# Altium footprint library 3D_MIG_Controller.PCBLIB: 560 footprints (part 30 of 35)
Each footprint in its own frame and in the unit in brackets; x right, y up, seen from the top. Pads: shape width x height; smd on the part's side, far side on the other; paste and mask are expansions set on the pad; w line width, h text height; cw(c..) or ccw(c..) is an arc to the next point about the centre after c.
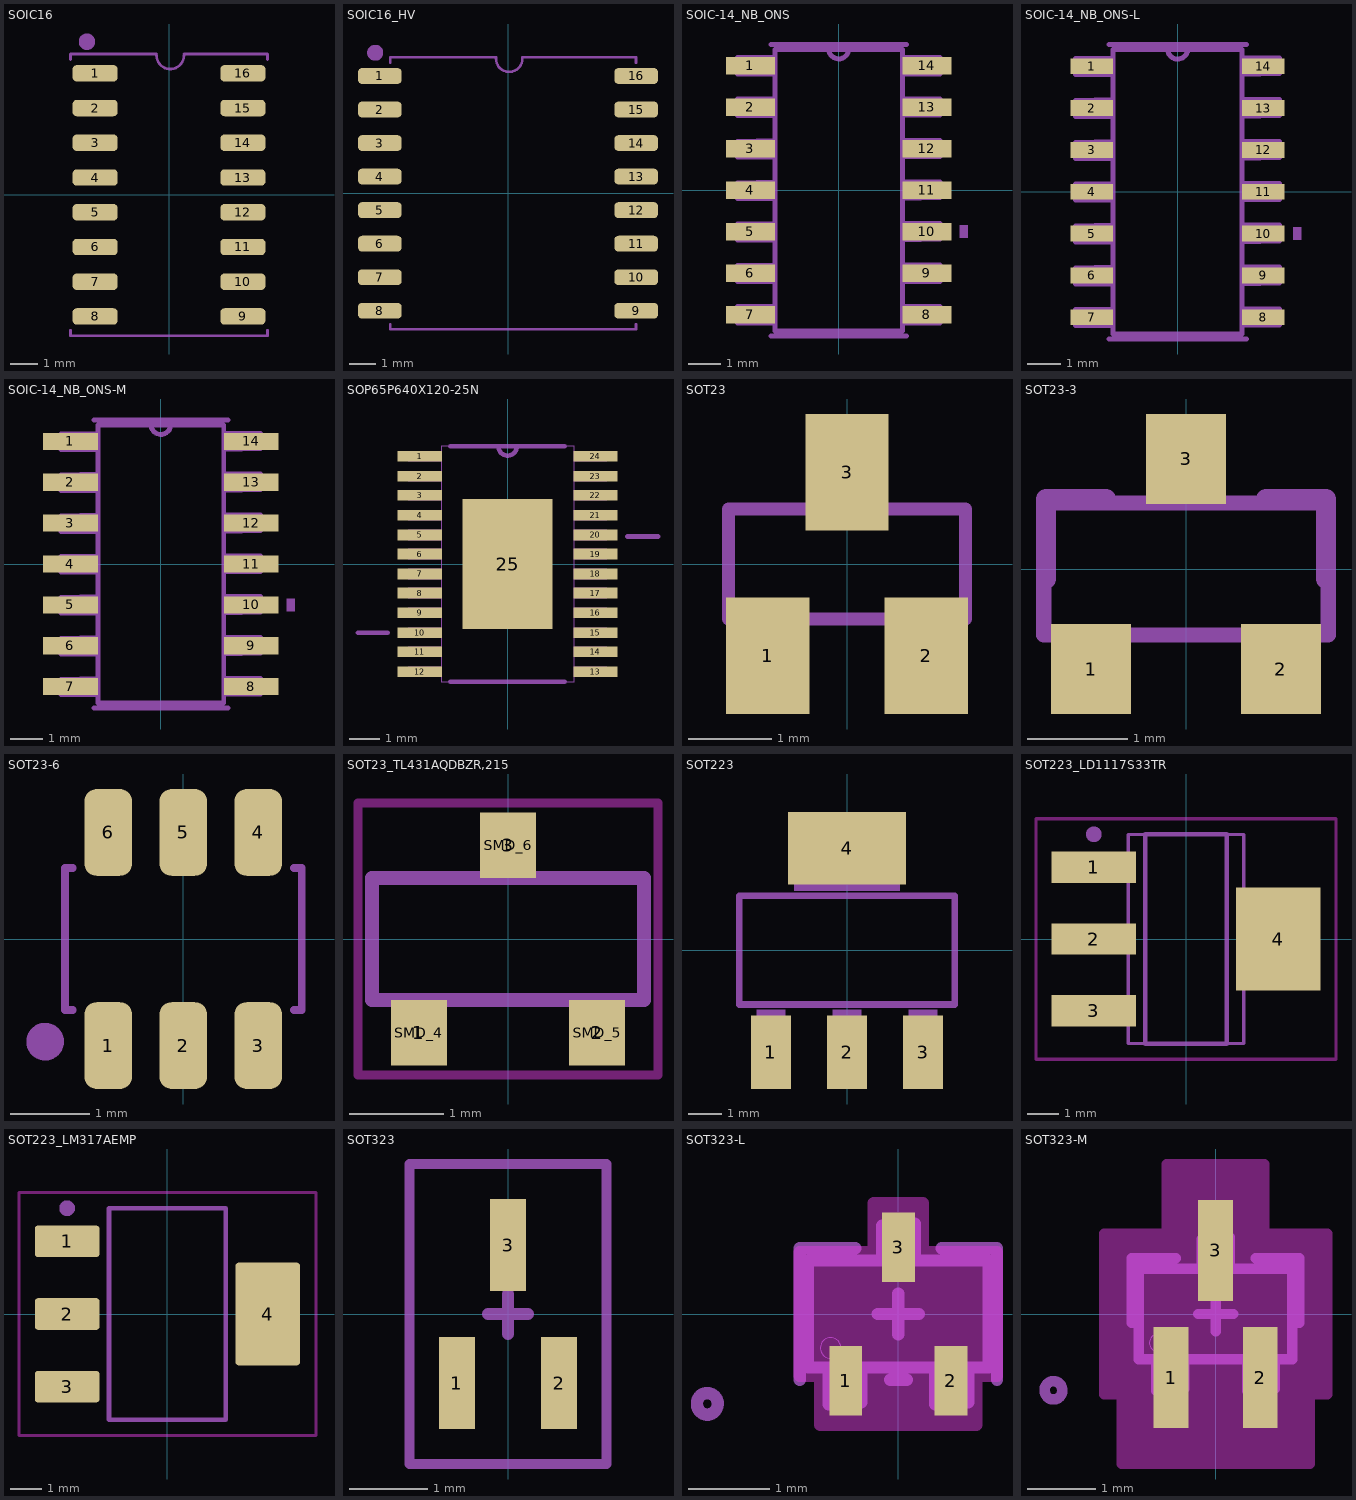
[diagram p29: the footprints below, top view; thin cyan lines are the x and y axes]

## SOIC16 [mm]
pads (16):
  rrect50% 1.65x0.6 smd: 1(-2.7,4.445) 2(-2.7,3.175) 3(-2.7,1.905) 4(-2.7,0.635) 5(-2.7,-0.635) 6(-2.7,-1.905) 7(-2.7,-3.175) 8(-2.7,-4.445) 9(2.7,-4.445) 10(2.7,-3.175) 11(2.7,-1.905) 12(2.7,-0.635) 13(2.7,0.635) 14(2.7,1.905) 15(2.7,3.175) 16(2.7,4.445)
tPlace:
  circle w0.4: c-3,5.6 r0.1
  lines w0.1: -3.6,-4.95 -3.6,-5.15 3.6,-5.15 3.6,-4.95 ; -3.6,4.95 -3.6,5.15 -0.455,5.15 ; -0.455,5.1 ccw(c0.045,5.1) 0.545,5.1 ; 0.545,5.15 3.6,5.15 3.6,4.95

## SOIC16_HV [mm]
pads (16):
  rrect50% 1.65x0.6 smd: 1(-4.855,4.445) 2(-4.855,3.175) 3(-4.855,1.905) 4(-4.855,0.635) 5(-4.855,-0.635) 6(-4.855,-1.905) 7(-4.855,-3.175) 8(-4.855,-4.445) 9(4.855,-4.445) 10(4.855,-3.175) 11(4.855,-1.905) 12(4.855,-0.635) 13(4.855,0.635) 14(4.855,1.905) 15(4.855,3.175) 16(4.855,4.445)
tPlace:
  circle w0.4: c-5.03,5.325 r0.1
  lines w0.1: -4.455,-4.95 -4.455,-5.15 4.845,-5.15 4.845,-4.95 ; -4.455,4.95 -4.455,5.15 -0.455,5.15 ; -0.455,5.1 ccw(c0.045,5.1) 0.545,5.1 ; 0.545,5.15 4.845,5.15 4.845,4.95

## SOIC-14_NB_ONS [mil]
pads (14):
  rect 59x21 smd: 1(-106.5,150) 2(-106.5,100) 3(-106.5,50) 4(-106.5,0) 5(-106.5,-50) 6(-106.5,-100) 7(-106.5,-150) 8(106.5,-150) 9(106.5,-100) 10(106.5,-50) 11(106.5,0) 12(106.5,50) 13(106.5,100) 14(106.5,150)
tDocu:
  lines w6: 12,171 cw(c0,170.5) -12,170 ; -12,170 77,170 77,-170 -77,-170 -77,170 -12,170 ; -122,-160 -122,-140 -77,-140 -77,-160 -122,-160 ; -122,-110 -122,-91 -77,-90 -77,-110 -122,-110 ; -122,-60 -122,-41 -77,-40 -77,-60 -122,-60 ; -122,-10 -122,9 -77,10 -77,-10 -122,-10 ; -122,40 -122,59 -77,60 -77,40 -122,40 ; -122,90 -122,110 -77,110 -77,90 -122,90 ; -122,140 -122,160 -77,160 -77,140 -122,140 ; 77,-160 77,-140 122,-140 122,-160 77,-160 ; 77,-110 77,-90 122,-90 122,-110 77,-110 ; 77,-60 77,-40 122,-40 122,-59 77,-60 ; 77,-10 77,10 122,10 122,-9 77,-10 ; 77,40 77,60 122,60 122,41 77,40 ; 77,90 77,110 122,110 122,91 77,90 ; 77,140 77,160 122,160 122,140 77,140
  text "*" at -85,118 h77.5
tPlace:
  region: 156,-42.5 156,-57.5 146,-57.5 146,-42.5
  lines w6: -82,-176 82,-176 ; -82,176 82,176
  text "*" at -139,166 h77.5

## SOIC-14_NB_ONS-L [mil]
pads (14):
  rect 51x19 smd: 1(-102.5,150) 2(-102.5,100) 3(-102.5,50) 4(-102.5,0) 5(-102.5,-50) 6(-102.5,-100) 7(-102.5,-150) 8(102.5,-150) 9(102.5,-100) 10(102.5,-50) 11(102.5,0) 12(102.5,50) 13(102.5,100) 14(102.5,150)
tDocu:
  lines w6: 12,171 cw(c0,170.5) -12,170 ; -12,170 77,170 77,-170 -77,-170 -77,170 -12,170 ; -122,-160 -122,-141 -77,-140 -77,-160 -122,-160 ; -122,-110 -122,-91 -77,-90 -77,-110 -122,-110 ; -122,-60 -122,-41 -77,-40 -77,-60 -122,-60 ; -122,-10 -122,9 -77,10 -77,-10 -122,-10 ; -122,40 -122,59 -77,60 -77,40 -122,40 ; -122,90 -122,109 -77,110 -77,90 -122,90 ; -122,140 -122,159 -77,160 -77,140 -122,140 ; 77,-160 77,-140 122,-140 122,-159 77,-160 ; 77,-110 77,-90 122,-90 122,-109 77,-110 ; 77,-60 77,-40 122,-40 122,-59 77,-60 ; 77,-10 77,10 122,10 122,-9 77,-10 ; 77,40 77,60 122,60 122,41 77,40 ; 77,90 77,110 122,110 122,91 77,90 ; 77,140 77,160 122,160 122,141 77,140
  text "*" at -85,118 h77.5
tPlace:
  region: 148,-42.5 148,-57.5 138,-57.5 138,-42.5
  lines w6: -82,-176 82,-176 ; -82,176 82,176
  text "*" at -135,164 h77.5

## SOIC-14_NB_ONS-M [mil]
pads (14):
  rect 67x21 smd: 1(-110.5,150) 2(-110.5,100) 3(-110.5,50) 4(-110.5,0) 5(-110.5,-50) 6(-110.5,-100) 7(-110.5,-150) 8(110.5,-150) 9(110.5,-100) 10(110.5,-50) 11(110.5,0) 12(110.5,50) 13(110.5,100) 14(110.5,150)
tDocu:
  lines w6: 12,171 cw(c0,170.5) -12,170 ; -12,170 77,170 77,-170 -77,-170 -77,170 -12,170 ; -122,-160 -122,-141 -77,-140 -77,-160 -122,-160 ; -122,-110 -122,-91 -77,-90 -77,-110 -122,-110 ; -122,-60 -122,-41 -77,-40 -77,-60 -122,-60 ; -122,-10 -122,9 -77,10 -77,-10 -122,-10 ; -122,40 -122,59 -77,60 -77,40 -122,40 ; -122,90 -122,109 -77,110 -77,90 -122,90 ; -122,140 -122,159 -77,160 -77,140 -122,140 ; 77,-160 77,-140 122,-140 122,-159 77,-160 ; 77,-110 77,-90 122,-90 122,-109 77,-110 ; 77,-60 77,-40 122,-40 122,-59 77,-60 ; 77,-10 77,10 122,10 122,-9 77,-10 ; 77,40 77,60 122,60 122,41 77,40 ; 77,90 77,110 122,110 122,91 77,90 ; 77,140 77,160 122,160 122,141 77,140
  text "*" at -85,118 h77.5
tPlace:
  region: 164,-42.5 164,-57.5 154,-57.5 154,-42.5
  lines w6: -82,-176 82,-176 ; -82,176 82,176
  text "*" at -143,166 h77.5

## SOP65P640X120-25N [mil]
pads (25):
  rect 58x14 smd: 1(-115,141) 2(-115,115) 3(-115,90) 4(-115,64) 5(-115,38) 6(-115,13) 7(-115,-13) 8(-115,-38) 9(-115,-64) 10(-115,-90) 11(-115,-115) 12(-115,-141) 13(115,-141) 14(115,-115) 15(115,-90) 16(115,-64) 17(115,-38) 18(115,-13) 19(115,13) 20(115,38) 21(115,64) 22(115,90) 23(115,115) 24(115,141)
  rect 118x170 smd: 25(0,0)
tDocu:
  lines w0: -12,154 12,154 ; -12,154 -87,154 -87,-154 87,-154 87,154 12,154 ; -12,154 ccw(c0,154) 12,154 ; -130,-147 -130,-135 -87,-135 -87,-147 -130,-147 ; -130,-121 -130,-109 -87,-109 -87,-121 -130,-121 ; -130,-96 -130,-84 -87,-84 -87,-96 -130,-96 ; -130,-70 -130,-58 -87,-58 -87,-70 -130,-70 ; -130,-44 -130,-32 -87,-32 -87,-44 -130,-44 ; -130,-19 -130,-7 -87,-7 -87,-19 -130,-19 ; -130,7 -130,19 -87,19 -87,7 -130,7 ; -130,32 -130,44 -87,44 -87,32 -130,32 ; -130,58 -130,70 -87,70 -87,58 -130,58 ; -130,84 -130,96 -87,96 -87,84 -130,84 ; -130,109 -130,121 -87,121 -87,109 -130,109 ; -130,135 -130,147 -87,147 -87,135 -130,135 ; 87,-147 87,-135 130,-135 130,-147 87,-147 ; 87,-121 87,-109 130,-109 130,-121 87,-121 ; 87,-96 87,-84 130,-84 130,-96 87,-96 ; 87,-70 87,-58 130,-58 130,-70 87,-70 ; 87,-44 87,-32 130,-32 130,-44 87,-44 ; 87,-19 87,-7 130,-7 130,-19 87,-19 ; 87,7 87,19 130,19 130,7 87,7 ; 87,32 87,44 130,44 130,32 87,32 ; 87,58 87,70 130,70 130,58 87,58 ; 87,84 87,96 130,96 130,84 87,84 ; 87,109 87,121 130,121 130,109 87,109 ; 87,135 87,147 130,147 130,135 87,135
  text "*" at -148,150 h62
tPlace:
  lines w6: -196,-90 -157,-90 ; -75,-154 75,-154 ; -75,154 -12,154 ; 75,154 12,154 ; 157,36 197,36 ; -12,154 12,154 ; -12,154 ccw(c0,154) 12,154
  text "*" at -148,150 h49.6

## SOT23 [mm]
pads (3):
  rect 1x1.4 smd: 1(-0.95,-1.1) 2(0.95,-1.1) 3(0,1.1)
tDocu:
  region: -0.229,0.711 -0.229,1.295 0.229,1.295 0.229,0.711
  region: 0.711,-1.295 0.711,-0.711 1.168,-0.711 1.168,-1.295
  region: -1.168,-1.295 -1.168,-0.711 -0.711,-0.711 -0.711,-1.295
  lines w0.152: -1.422,-0.66 1.422,-0.66 1.422,0.66 -1.422,0.66 -1.422,-0.66

## SOT23-3 [mil]
pads (3):
  rect 31.5x35.43 smd: 1(-37.4,-39.37) 2(37.4,-39.37) 3(0,43.31)
tDocu:
  lines w6: -56,-26 56,-26 56,26 -56,26 -56,-26
tPlace:
  lines w8: -55.12,-3.94 -55.12,27.56 -31.5,27.56 ; 31.5,27.56 55.12,27.56 55.12,-3.94

## SOT23-6 [mm]
pads (6):
  rrect50% 0.6x1.1 smd: 1(-0.95,-1.35) 2(0,-1.35) 3(0.95,-1.35) 4(0.95,1.35) 5(0,1.35) 6(-0.95,1.35)
tPlace:
  circle w0.254: c-1.75,-1.3 r0.112
  lines w0.1: -1.4,-0.9 -1.5,-0.9 -1.5,0.9 -1.4,0.9 ; 1.4,-0.9 1.5,-0.9 1.5,0.9 1.4,0.9

## SOT23_TL431AQDBZR,215 [mm]
pads (6):
  rect 0.6x0.7 smd: 1(-0.95,-1) 2(0.95,-1) 3(0,1)
  rect 0.5x0.6 smd: SMD_4(-0.95,-1) SMD_5(0.95,-1) SMD_6(0,1)
Top keep-out:
  lines w0.1: -1.6,-1.45 -1.6,1.45 1.6,1.45 1.6,-1.45 -1.6,-1.45
tDocu:
  lines w0.15: -1.45,-0.65 -1.45,0.65 1.45,0.65 1.45,-0.65 -1.45,-0.65
tPlace:
  lines w0.15: -1.45,0.249 -1.45,0.649 ; -1.45,0.65 -1.049,0.65 ; -0.1,-0.65 0.1,-0.65 ; 1.05,0.65 1.45,0.65 ; 1.451,0.249 1.451,0.649

## SOT223 [mil]
pads (4):
  rect 48x88 smd: 1(-91,-122) 2(0,-122) 3(91,-122)
  rect 141.73x86.61 smd: 4(0,122.01)
tDocu:
  region: -63,71 -63,144 63,144 63,71
  region: -17,-144 -17,-71 17,-71 17,-144
  region: -108,-144 -108,-71 -74,-71 -74,-144
  region: 74,-144 74,-71 108,-71 108,-144
  region: -63,71 -63,144 63,144 63,71
  region: -17,-144 -17,-71 17,-71 17,-144
  region: -108,-144 -108,-71 -74,-71 -74,-144
  region: 74,-144 74,-71 108,-71 108,-144
tPlace:
  lines w8: -129,-65 129,-65 129,65 -129,65 -129,-65

## SOT223_LD1117S33TR [mm]
pads (4):
  rect 2.7x1 smd: 1(-2.95,2.3) 2(-2.95,0) 3(-2.95,-2.3)
  rect 2.7x3.3 smd: 4(2.95,0)
Top keep-out:
  lines w0.1: -4.8,-3.85 -4.8,3.85 4.8,3.85 4.8,-3.85 -4.8,-3.85
tDocu:
  lines w0.1: -1.85,-3.35 1.85,-3.35 1.85,3.35 -1.85,3.35 -1.85,-3.35
tPlace:
  circle w0.25: c-2.95,3.35 r0.125
  lines w0.15: -1.3,-3.35 1.3,-3.35 1.3,3.35 -1.3,3.35 -1.3,-3.35

## SOT223_LM317AEMP [mm]
pads (4):
  rrect20% 2.05x1 smd: 1(-3.175,2.3) 2(-3.175,0) 3(-3.175,-2.3)
  rrect10% 2.05x3.25 smd: 4(3.175,0)
Top keep-out:
  lines w0.1: -4.7,-3.85 -4.7,3.85 4.7,3.85 4.7,-3.85 -4.7,-3.85
tDocu:
  lines w0.1: -1.85,-3.35 -1.85,3.35 1.85,3.35 1.85,-3.35 -1.85,-3.35
tPlace:
  circle w0.25: c-3.175,3.35 r0.125
  lines w0.15: -1.85,-3.35 -1.85,3.35 1.85,3.35 1.85,-3.35 -1.85,-3.35

## SOT323 [mil]
pads (3):
  rect 18x46 smd: 1(-25.59,-34.5) 2(25.59,-34.5) 3(0,34.5)
tPlace:
  lines w5: -49.21,-75 49.21,-75 49.21,75 -49.21,75 -49.21,-75
tOrigins:
  lines w6: -10,0 10,0 ; 0,-10 0,10

## SOT323-L [mil]
pads (3):
  rect 16x34 smd: 1(-25.59,-32.5) 2(25.59,-32.5) 3(0,32.5)
Top keep-out:
  region: -47.5,30.5 -12,30.5 -12,53.5 12,53.5 12,30.5 47.5,30.5 47.5,-30.5 37.59,-30.5 37.59,-53.5 -37.59,-53.5 -37.59,-30.5 -47.5,-30.5
  region: -43.5,-26.5 -43.5,26.5 43.5,26.5 43.5,-26.5
  lines w6: -48,-30 -48,30 -12,30 -12,54 12,54 12,30 48,30 48,-30 38,-30 38,-54 -38,-54 -38,-30 -48,-30
tDocu:
  lines w0: -38,-17 ccw(c-33,-16.5) -28,-16 ccw(c-33,-16.5) -38,-17
  lines w6: -44,-26 44,-26 44,26 -44,26 -44,-26 ; -34,-44 -34,-27 -18,-26 -18,-43 -34,-44 ; -8,26 8,27 8,44 -8,43 -8,26 ; 18,-44 18,-27 34,-26 34,-43 18,-44
tPlace:
  lines w6: -88,-44 cw(c-93,-44) -98,-44 cw(c-93,-43.5) -88,-43 ; -48,-32 -48,32 -21,32 ; -4,-32 4,-32 ; 21,32 48,32 48,-32
tOrigins:
  lines w6: -10,0 10,0 ; 0,-10 0,10

## SOT323-M [mil]
pads (3):
  rect 20x58 smd: 1(-25.59,-36.5) 2(25.59,-36.5) 3(0,36.5)
Top keep-out:
  region: -63.5,46.5 -28,46.5 -28,85.5 28,85.5 28,46.5 63.5,46.5 63.5,-46.5 53.59,-46.5 53.59,-85.5 -53.59,-85.5 -53.59,-46.5 -63.5,-46.5
  region: -43.5,-26.5 -43.5,26.5 43.5,26.5 43.5,-26.5
  lines w6: -64,-46 -64,46 -28,46 -28,86 28,86 28,46 64,46 64,-46 54,-46 54,-86 -54,-86 -54,-46 -64,-46
tDocu:
  lines w0: -38,-17 ccw(c-33,-16.5) -28,-16 ccw(c-33,-16.5) -38,-17
  lines w6: -44,-26 44,-26 44,26 -44,26 -44,-26 ; -34,-44 -34,-27 -18,-26 -18,-43 -34,-44 ; -8,26 8,27 8,44 -8,43 -8,26 ; 18,-44 18,-27 34,-26 34,-43 18,-44
tPlace:
  lines w6: -88,-44 cw(c-93,-44) -98,-44 cw(c-93,-43.5) -88,-43 ; -48,-5 -48,32 -23,32 ; 23,32 48,32 48,-5
tOrigins:
  lines w6: -10,0 10,0 ; 0,-10 0,10